# Altium footprint library 6-Connectors-6.PcbLib: 117 footprints (part 5 of 8)
Each footprint in its own frame and in the unit in brackets; x right, y up, seen from the top. Pads: shape width x height; smd on the part's side, far side on the other; paste and mask are expansions set on the pad; w line width, h text height; cw(c..) or ccw(c..) is an arc to the next point about the centre after c.
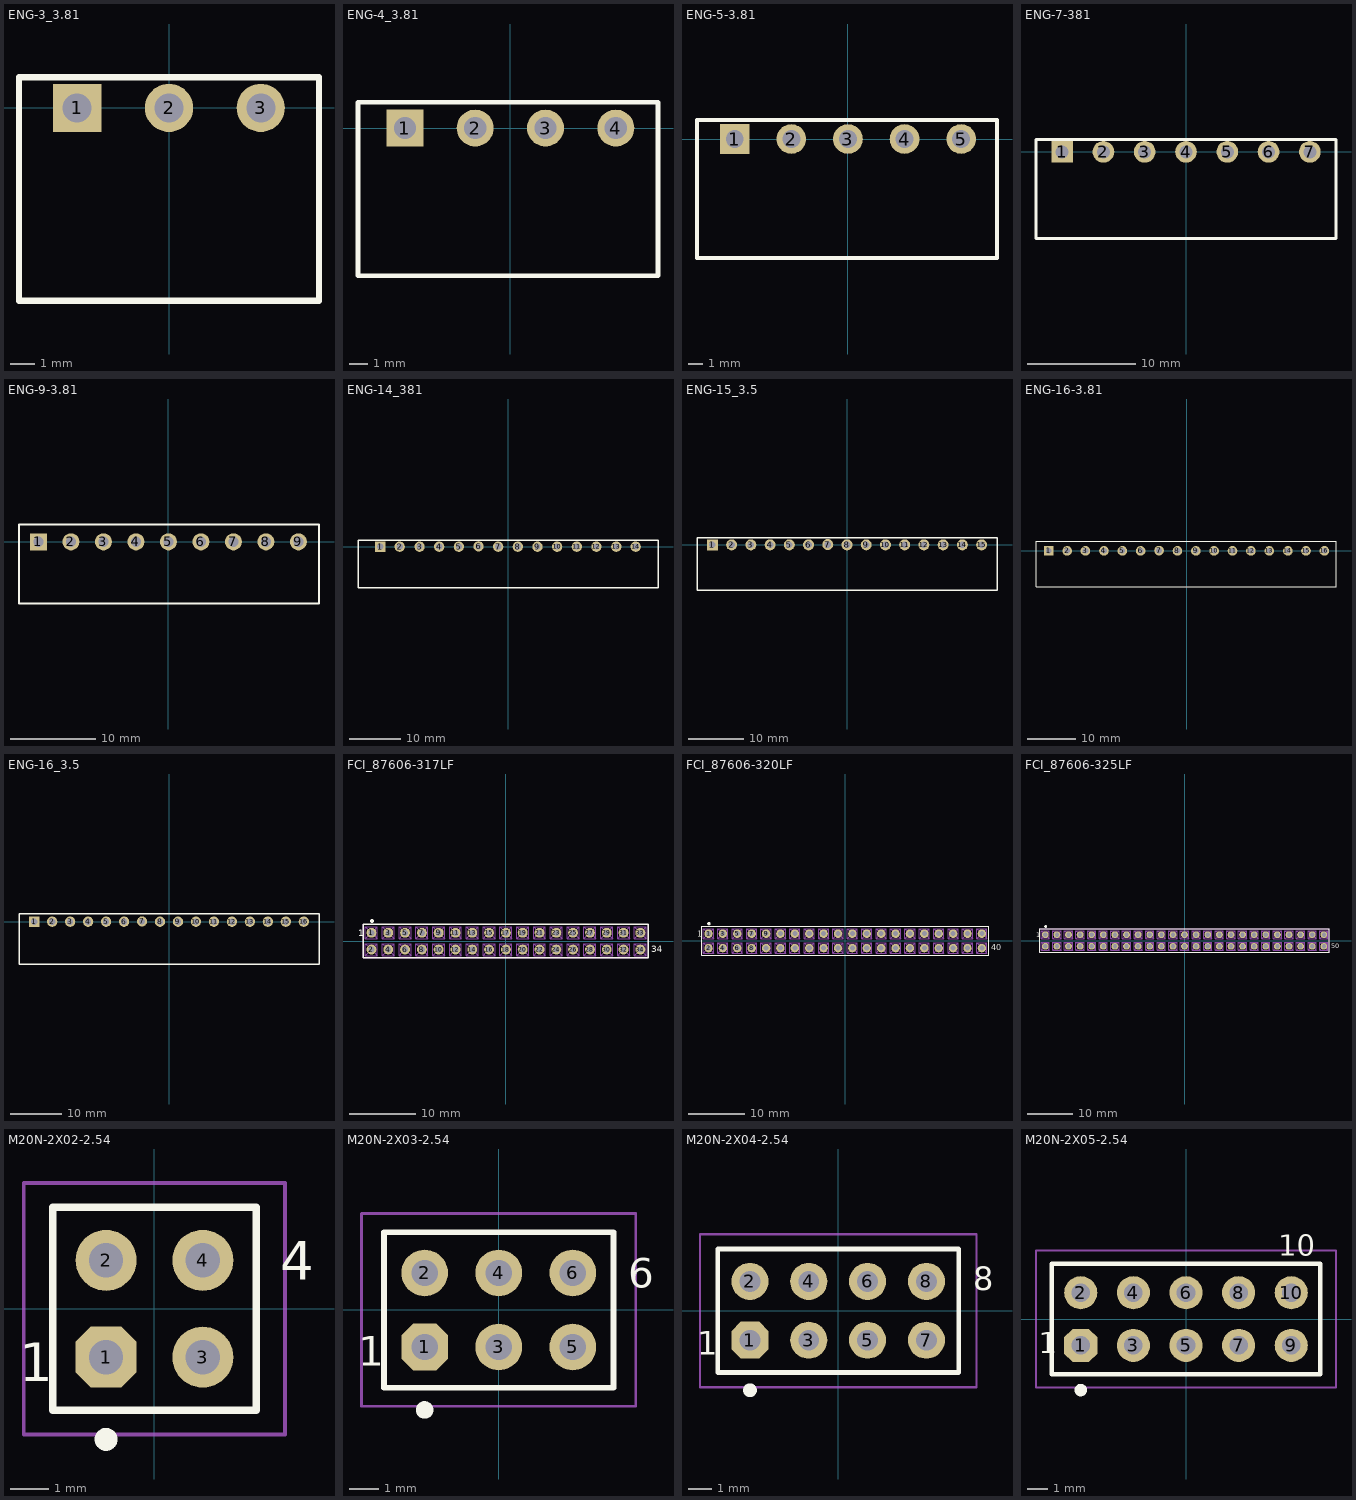
[diagram p4: the footprints below, top view; thin cyan lines are the x and y axes]

## ENG-3_3.81 [mm]
height 21.1
pads (3):
  rect 2x2 hole 1.2 mask+0.07: 1(-3.81,0)
  round 2 hole 1.2 mask+0.07: 2(0,0)
  round 2 hole 1.2: 3(3.81,0)
Top Overlay:
  lines w0.254: -6.223,-8.001 6.223,-8.001 6.223,1.27 -6.223,1.27 -6.223,-8.001
3D body "15-end3p-35.stp": height 7.3, standoff -3.4, extent -6.25,-8.004 6.25,1.196

## ENG-4_3.81 [mm]
height 21.1
pads (4):
  rect 2x2 hole 1.2 mask+0.07: 1(-5.715,0)
  round 2 hole 1.2 mask+0.07: 2(-1.905,0) 3(1.905,0)
  round 2 hole 1.2: 4(5.715,0)
Top Overlay:
  lines w0.254: -8.255,-8.001 8.001,-8.001 8.001,1.397 -8.255,1.397 -8.255,-8.001
3D body "15-end3p-35.stp": height 7.3, standoff -3.4, extent -4.497,-8.004 8.003,1.196
3D body "15-end3p-35.stp": height 7.3, standoff -3.4, extent -8.155,-8.004 4.345,1.196

## ENG-5-3.81 [mm]
height 21.1
pads (5):
  rect 2x2 hole 1.2 mask+0.07: 1(-7.62,0)
  round 2 hole 1.2 mask+0.07: 2(-3.81,0) 3(0,0) 5(7.62,0)
  round 2 hole 1.2: 4(3.81,0)
Top Overlay:
  lines w0.254: -10.16,-8.001 10.033,-8.001 10.033,1.27 -10.16,1.27 -10.16,-8.001
3D body "15-end3p-35.stp": height 7.3, standoff -3.4, extent -2.518,-8.004 9.982,1.196
3D body "15-end3p-35.stp": height 7.3, standoff -3.4, extent -10.06,-8.004 2.44,1.196

## ENG-7-381 [mm]
height 21.1
pads (7):
  rect 2x2 hole 1.2 mask+0.07: 1(-11.43,0)
  round 2 hole 1.2 mask+0.07: 2(-7.62,0) 3(-3.81,0) 4(0,0) 5(3.81,0) 6(7.62,0)
  round 2 hole 1.2: 7(11.43,0)
Top Overlay:
  lines w0.254: -13.843,-8.001 13.843,-8.001 13.843,1.143 -13.843,1.143 -13.843,-8.001
3D body "15-end3p-35.stp": height 7.3, standoff -3.4, extent 1.343,-8.014 13.843,1.186
3D body "15-end3p-35.stp": height 7.3, standoff -3.4, extent -6.048,-8.029 6.452,1.171
3D body "15-end3p-35.stp": height 7.3, standoff -3.4, extent -13.87,-8.004 -1.37,1.196

## ENG-9-3.81 [mm]
height 21.1
pads (9):
  rect 2x2 hole 1.2 mask+0.07: 1(-15.24,0)
  round 2 hole 1.2 mask+0.07: 2(-11.43,0) 3(-7.62,0) 5(0,0) 6(3.81,0) 7(7.62,0) 8(11.43,0) 9(15.24,0)
  round 2 hole 1.2: 4(-3.81,0)
Top Overlay:
  lines w0.254: -17.526,-7.239 17.653,-7.239 17.653,2.032 -17.526,2.032 -17.526,-7.239
3D body "eng-9_381.stp": height 7.3, standoff -3.4, extent -17.55,-7.226 17.6,1.974

## ENG-14_381 [mm]
height 21.1
pads (14):
  rect 2x2 hole 1.2 mask+0.07: 1(-24.765,0)
  round 2 hole 1.2 mask+0.07: 2(-20.995,0) 3(-17.145,0) 5(-9.525,0) 6(-5.715,0.051) 7(-1.905,0) 8(1.905,0) 9(5.715,0) 10(9.525,0) 11(13.335,0) 12(17.145,0) 13(20.995,0) 14(24.765,0)
  round 2 hole 1.2: 4(-13.335,0)
Top Overlay:
  lines w0.254: -29.083,-8.001 29.083,-8.001 29.083,1.27 -29.083,1.27 -29.083,-8.001
3D body "15edgkrc-16l.stp": height 7.3, standoff -3.4, extent -29.012,-8.029 28.987,1.171

## ENG-15_3.5 [mm]
height 21.1
pads (15):
  rect 2x2 hole 1.2 mask+0.07: 1(-24.5,0)
  round 2 hole 1.2 mask+0.07: 2(-21,0) 3(-17.5,0) 4(-14,0) 5(-10.5,0) 6(-7,0) 7(-3.5,0.051) 8(0,0) 9(3.5,0) 10(7,0) 12(14,0) 13(17.5,0) 14(21,0) 15(24.5,0)
  round 2 hole 1.2: 11(10.5,0)
Top Overlay:
  lines w0.254: -27.305,-8.255 27.305,-8.255 27.305,1.27 -27.305,1.27 -27.305,-8.255
3D body "284512-15.stp": height 7.3, standoff -3.4, extent -27.25,-8.184 27.25,1.016

## ENG-16-3.81 [mm]
height 21.1
pads (16):
  rect 2x2 hole 1.2 mask+0.07: 1(-28.575,0)
  round 2 hole 1.2 mask+0.07: 2(-24.765,0) 3(-20.995,0) 4(-17.145,0) 6(-9.525,0) 7(-5.715,0.051) 8(-1.905,0) 9(1.905,0) 10(5.715,0) 11(9.525,0) 12(13.335,0) 13(17.145,0) 14(20.995,0) 15(24.765,0) 16(28.575,0)
  round 2 hole 1.2: 5(-13.335,0)
Top Overlay:
  lines w0.254: -31.242,-7.493 30.988,-7.493 30.988,2.032 -31.242,2.032 -31.242,-7.493
3D body "eng-16_381.stp": height 7.3, standoff -3.4, extent -31.05,-7.371 30.77,1.829

## ENG-16_3.5 [mm]
height 21.1
pads (16):
  rect 2x2 hole 1.2 mask+0.07: 1(-26.25,0)
  round 2 hole 1.2 mask+0.07: 2(-22.75,0) 3(-19.25,0) 4(-15.75,0) 5(-12.25,0) 6(-8.75,0) 7(-5.25,0.051) 8(-1.75,0) 9(1.75,0) 10(5.25,0) 11(8.75,0) 12(12.25,0) 13(15.75,0) 14(19.25,0) 15(22.75,0)
  round 2 hole 1.2: 16(26.25,0)
Top Overlay:
  lines w0.254: -29.21,-8.255 29.21,-8.255 29.21,1.524 -29.21,1.524 -29.21,-8.255
3D body "15edgkrc-16l.stp": height 7.3, standoff -3.4, extent -29.012,-8.029 28.987,1.171

## FCI_87606-317LF [mm] "34 Contacts - Pitch 2.54mm - Top Entry, Dual Row Through Mount Receptacle"
height 8.5
pads (34):
  round 1.5 hole 0.9: 1(-20.32,1.27) 2(-20.32,-1.27) 3(-17.78,1.27) 4(-17.78,-1.27) 5(-15.24,1.27) 6(-15.24,-1.27) 7(-12.7,1.27) 8(-12.7,-1.27) 9(-10.16,1.27) 10(-10.16,-1.27) 11(-7.62,1.27) 12(-7.62,-1.27) 13(-5.08,1.27) 14(-5.08,-1.27) 15(-2.54,1.27) 16(-2.54,-1.27) 17(0,1.27) 18(0,-1.27) 19(2.54,1.27) 20(2.54,-1.27) 21(5.08,1.27) 22(5.08,-1.27) 23(7.62,1.27) 24(7.62,-1.27) 25(10.16,1.27) 26(10.16,-1.27) 27(12.7,1.27) 28(12.7,-1.27) 29(15.24,1.27) 30(15.24,-1.27) 31(17.78,1.27) 32(17.78,-1.27) 33(20.32,1.27) 34(20.32,-1.27)
Top Overlay:
  circle w0.3: c-20.247,3.048 r0.15
  lines w0.2: -21.55,-2.54 -21.55,2.54 21.55,2.54 21.55,-2.54 -21.55,-2.54
  text "34" at 21.971,-1.651 h1.02
  text "1" at -22.352,0.762 h1.02
Mechanical 14:
  drawing of 413 lines, arcs and shapes, not listed
  text "34" at 21.971,-1.651 h1.02
  text "1" at -22.352,0.762 h1.02
3D body "FCI_87606-317LF.stp": height 8.5, standoff -2.9, extent -21.59,-2.54 21.59,2.54

## FCI_87606-320LF [mm] "40 Contacts - Pitch 2.54mm - Top Entry, Dual Row Through Mount Receptacle"
height 8.5
pads (40):
  round 1.5 hole 0.9: 1(-24.13,1.27) 2(-24.13,-1.27) 3(-21.59,1.27) 4(-21.59,-1.27) 5(-19.05,1.27) 6(-19.05,-1.27) 7(-16.51,1.27) 8(-16.51,-1.27) 9(-13.97,1.27) 10(-13.97,-1.27) 11(-11.43,1.27) 12(-11.43,-1.27) 13(-8.89,1.27) 14(-8.89,-1.27) 15(-6.35,1.27) 16(-6.35,-1.27) 17(-3.81,1.27) 18(-3.81,-1.27) 19(-1.27,1.27) 20(-1.27,-1.27) 21(1.27,1.27) 22(1.27,-1.27) 23(3.81,1.27) 24(3.81,-1.27) 25(6.35,1.27) 26(6.35,-1.27) 27(8.89,1.27) 28(8.89,-1.27) 29(11.43,1.27) 30(11.43,-1.27) 31(13.97,1.27) 32(13.97,-1.27) 33(16.51,1.27) 34(16.51,-1.27) 35(19.05,1.27) 36(19.05,-1.27) 37(21.59,1.27) 38(21.59,-1.27) 39(24.13,1.27) 40(24.13,-1.27)
Top Overlay:
  circle w0.3: c-24.057,3.048 r0.15
  lines w0.2: -25.36,-2.54 25.36,-2.54 25.36,2.54 -25.36,2.54 -25.36,-2.54
  text "40" at 25.781,-1.651 h1.02
  text "1" at -26.162,0.762 h1.02
Mechanical 14:
  drawing of 485 lines, arcs and shapes, not listed
  text "40" at 25.781,-1.651 h1.02
  text "1" at -26.162,0.762 h1.02
3D body "FCI_87606-320LF.stp": height 8.5, standoff -2.9, extent -25.4,-2.54 25.4,2.54

## FCI_87606-325LF [mm] "50 Contacts - Pitch 2.54mm - Top Entry, Dual Row Through Mount Receptacle"
height 8.5
pads (50):
  round 1.5 hole 0.9: 1(-30.48,1.27) 2(-30.48,-1.27) 3(-27.94,1.27) 4(-27.94,-1.27) 5(-25.4,1.27) 6(-25.4,-1.27) 7(-22.86,1.27) 8(-22.86,-1.27) 9(-20.32,1.27) 10(-20.32,-1.27) 11(-17.78,1.27) 12(-17.78,-1.27) 13(-15.24,1.27) 14(-15.24,-1.27) 15(-12.7,1.27) 16(-12.7,-1.27) 17(-10.16,1.27) 18(-10.16,-1.27) 19(-7.62,1.27) 20(-7.62,-1.27) 21(-5.08,1.27) 22(-5.08,-1.27) 23(-2.54,1.27) 24(-2.54,-1.27) 25(0,1.27) 26(0,-1.27) 27(2.54,1.27) 28(2.54,-1.27) 29(5.08,1.27) 30(5.08,-1.27) 31(7.62,1.27) 32(7.62,-1.27) 33(10.16,1.27) 34(10.16,-1.27) 35(12.7,1.27) 36(12.7,-1.27) 37(15.24,1.27) 38(15.24,-1.27) 39(17.78,1.27) 40(17.78,-1.27) 41(20.32,1.27) 42(20.32,-1.27) 43(22.86,1.27) 44(22.86,-1.27) 45(25.4,1.27) 46(25.4,-1.27) 47(27.94,1.27) 48(27.94,-1.27) 49(30.48,1.27) 50(30.48,-1.27)
Top Overlay:
  circle w0.3: c-30.407,3.048 r0.15
  lines w0.2: -31.71,-2.54 -31.71,2.54 31.71,2.54 31.71,-2.54 -31.71,-2.54
  text "1" at -32.512,0.762 h1.02
  text "50" at 32.131,-1.651 h1.02
Mechanical 14:
  drawing of 605 lines, arcs and shapes, not listed
  text "50" at 32.131,-1.651 h1.02
  text "1" at -32.512,0.761 h1.02
3D body "FCI_87606-325LF.stp": height 8.5, standoff -2.9, extent -31.85,-2.54 31.85,2.54

## M20N-2X02-2.54 [mm]
height 11
pads (4):
  oct 1.6x1.6 hole 0.9: 1(-1.27,-1.27)
  round 1.6 hole 0.9: 2(-1.27,1.27) 3(1.27,-1.27) 4(1.27,1.27)
Top Overlay:
  circle w0.3: c-1.27,-3.429 r0.15
  lines w0.2: -2.667,-2.667 -2.667,2.667 2.667,2.667 2.667,-2.667 -2.667,-2.667
  text "4" at 3.302,0.762 h1.02
  text "1" at -3.556,-1.905 h1.02
Mechanical 8:
  lines w0.1: -3.429,-3.302 -3.429,3.302 3.429,3.302 3.429,-3.302 -3.429,-3.302
Mechanical 15:
  lines w0.1: -2.667,-2.667 2.667,-2.667 2.667,2.667 -2.667,2.667 -2.667,-2.667
3D body "m20-9980242.stp": height 9.54, standoff -3, extent -2.54,-2.54 2.54,2.54

## M20N-2X03-2.54 [mm]
height 11
pads (6):
  oct 1.6x1.6 hole 0.9: 1(-2.54,-1.27)
  round 1.6 hole 0.9: 2(-2.54,1.27) 3(0,-1.27) 4(0,1.27) 5(2.54,-1.27) 6(2.54,1.27)
Top Overlay:
  circle w0.3: c-2.54,-3.429 r0.15
  lines w0.2: -3.937,-2.667 3.937,-2.667 3.937,2.667 -3.937,2.667 -3.937,-2.667
  text "1" at -4.826,-1.905 h1.02
  text "6" at 4.445,0.762 h1.02
Mechanical 8:
  lines w0.1: -4.699,-3.302 4.699,-3.302 4.699,3.302 -4.699,3.302 -4.699,-3.302
Mechanical 15:
  lines w0.1: -3.937,-2.667 -3.937,2.667 3.937,2.667 3.937,-2.667 -3.937,-2.667
3D body "m20-9980342.stp": height 9.54, standoff -3, extent -3.81,-2.54 3.81,2.54

## M20N-2X04-2.54 [mm]
height 11
pads (8):
  oct 1.6x1.6 hole 0.9: 1(-3.81,-1.27)
  round 1.6 hole 0.9: 2(-3.81,1.27) 3(-1.27,-1.27) 4(-1.27,1.27) 5(1.27,-1.27) 6(1.27,1.27) 7(3.81,-1.27) 8(3.81,1.27)
Top Overlay:
  circle w0.3: c-3.81,-3.429 r0.15
  lines w0.2: -5.207,-2.667 5.207,-2.667 5.207,2.667 -5.207,2.667 -5.207,-2.667
  text "1" at -6.096,-1.905 h1.02
  text "8" at 5.842,0.889 h1.02
Mechanical 8:
  lines w0.1: -5.969,-3.302 5.969,-3.302 5.969,3.302 -5.969,3.302 -5.969,-3.302
Mechanical 15:
  lines w0.1: -5.207,-2.667 -5.207,2.667 5.207,2.667 5.207,-2.667 -5.207,-2.667
3D body "m20-254via.stp": height 0.1, standoff -1.82, extent -4.66,0.42 -2.96,2.12
3D body "m20-254via.stp": height 0.1, standoff -1.82, extent -2.12,0.42 -0.42,2.12
3D body "m20-254via.stp": height 0.1, standoff -1.82, extent 0.42,0.42 2.12,2.12
3D body "m20-254via.stp": height 0.1, standoff -1.82, extent 2.96,0.42 4.66,2.12
3D body "m20-254via.stp": height 0.1, standoff -1.82, extent 2.96,-2.12 4.66,-0.42
3D body "m20-254via.stp": height 0.1, standoff -1.82, extent 0.42,-2.12 2.12,-0.42
3D body "m20-254via.stp": height 0.1, standoff -1.82, extent -2.12,-2.12 -0.42,-0.42
3D body "m20-254via.stp": height 0.1, standoff -1.82, extent -4.66,-2.12 -2.96,-0.42
3D body "m20-9980442.stp": height 9.54, standoff -3, extent -5.08,-2.54 5.08,2.54

## M20N-2X05-2.54 [mm]
height 11
pads (10):
  oct 1.6x1.6 hole 0.9: 1(-5.08,-1.27)
  round 1.6 hole 0.9: 2(-5.08,1.27) 3(-2.54,-1.27) 4(-2.54,1.27) 5(0,-1.27) 6(0,1.27) 7(2.54,-1.27) 8(2.54,1.27) 9(5.08,-1.27) 10(5.08,1.27)
Top Overlay:
  circle w0.3: c-5.08,-3.429 r0.15
  lines w0.2: -6.477,-2.667 -6.477,2.667 6.477,2.667 6.477,-2.667 -6.477,-2.667
  text "10" at 4.445,3.048 h1.02
  text "1" at -7.112,-1.651 h1.02
Mechanical 8:
  lines w0.1: -7.239,-3.302 -7.239,3.302 7.239,3.302 7.239,-3.302 -7.239,-3.302
Mechanical 15:
  lines w0.1: -6.477,-2.667 6.477,-2.667 6.477,2.667 -6.477,2.667 -6.477,-2.667
3D body "m20-254via.stp": height 0.1, standoff -1.82, extent 4.23,-2.12 5.93,-0.42
3D body "m20-254via.stp": height 0.1, standoff -1.82, extent 1.69,-2.12 3.39,-0.42
3D body "m20-254via.stp": height 0.1, standoff -1.82, extent -0.85,-2.1 0.85,-0.4
3D body "m20-254via.stp": height 0.1, standoff -1.82, extent -3.375,-2.1 -1.675,-0.4
3D body "m20-254via.stp": height 0.1, standoff -1.82, extent 4.275,0.425 5.975,2.125
3D body "m20-254via.stp": height 0.1, standoff -1.82, extent 1.7,0.425 3.4,2.125
3D body "m20-254via.stp": height 0.1, standoff -1.82, extent -0.85,0.42 0.85,2.12
3D body "m20-254via.stp": height 0.1, standoff -1.82, extent -3.39,0.42 -1.69,2.12
3D body "m20-254via.stp": height 0.1, standoff -1.82, extent -5.93,0.42 -4.23,2.12
3D body "m20-254via.stp": height 0.1, standoff -1.82, extent -5.93,-2.12 -4.23,-0.42
3D body "m20-9980542.stp": height 9.54, standoff -3, extent -6.35,-2.54 6.35,2.54